# Altium schematic symbol library Semi-ATE.SchLib: 322 symbols (part 1 of 6)
Pins are listed as number, name and electrical type; pins without a type are passive.

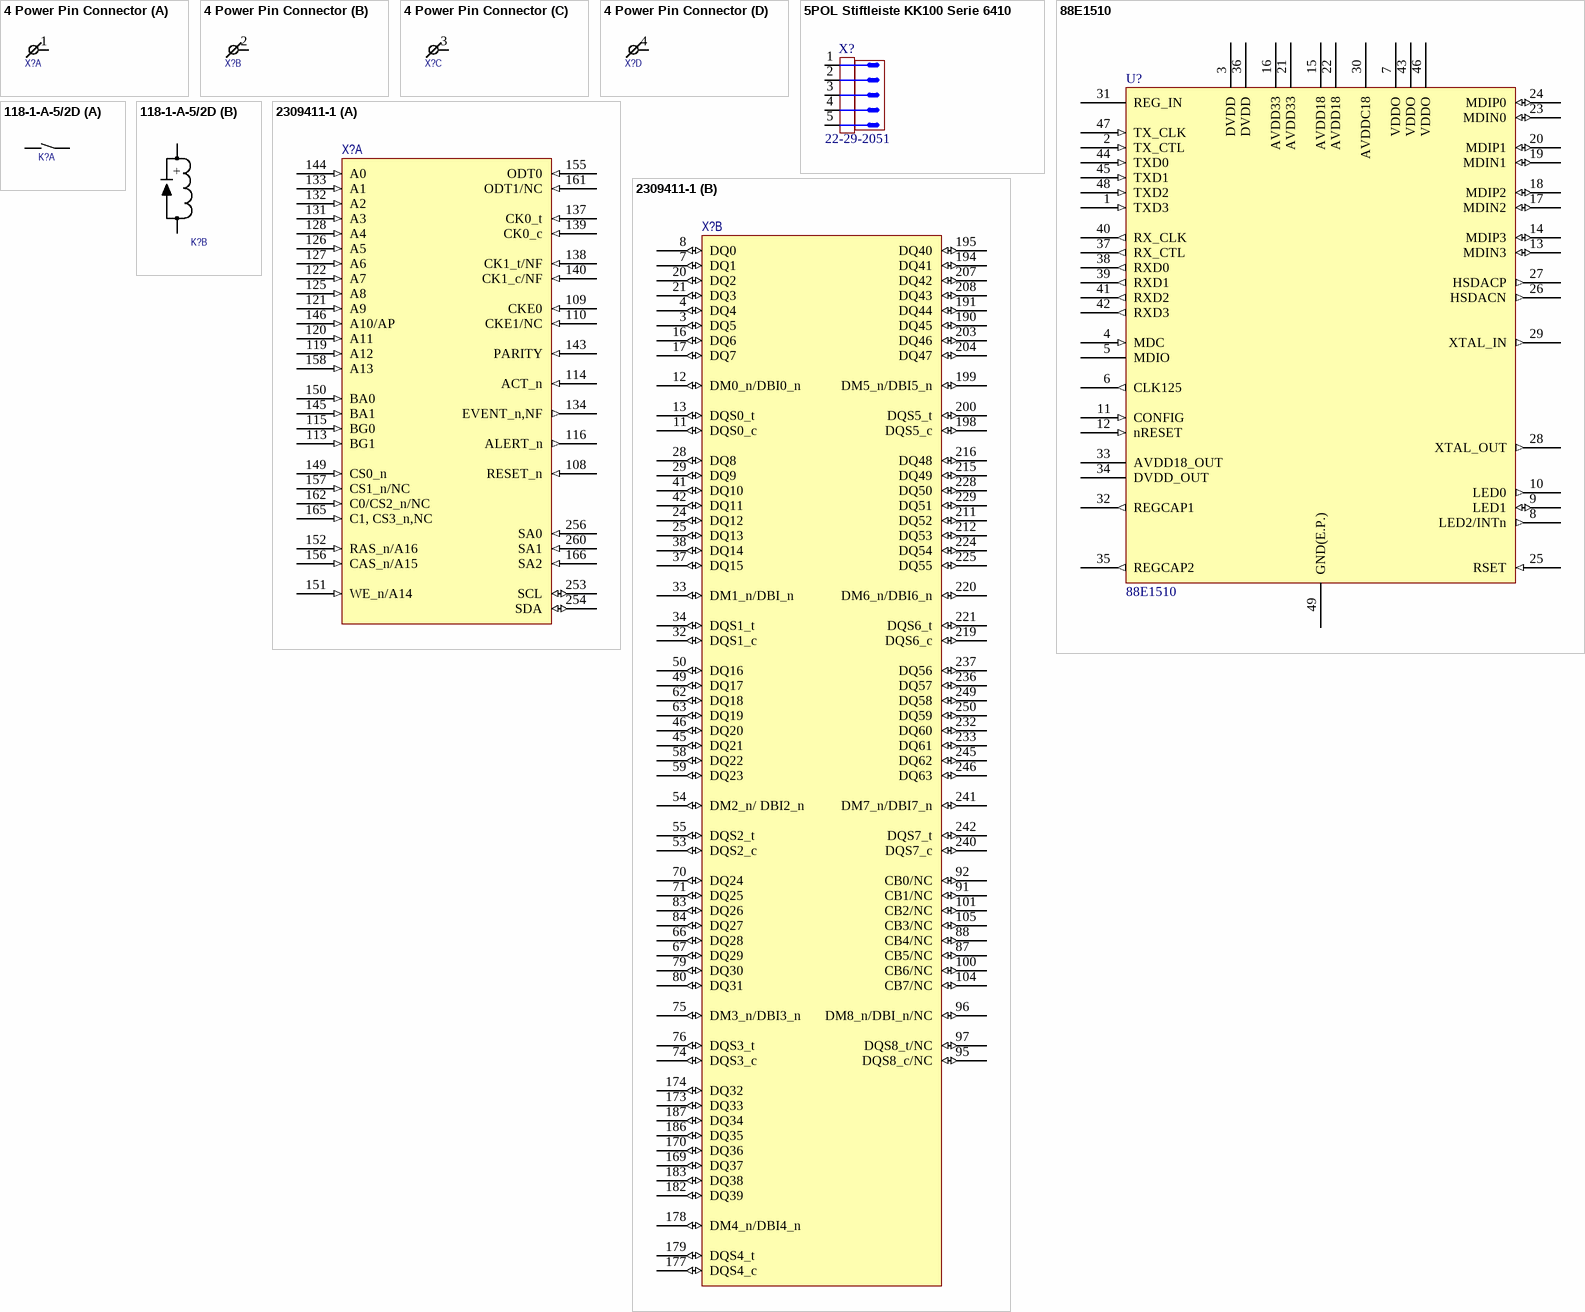
[diagram p0: symbols 4 Power Pin Connector to 2309411-1]

## 4 Power Pin Connector
designator X?, comment X  (value not drawn)
RA TERMINAL 4PM; 04. Manufacturer: Samtec Inc.; 07. Manufacturer  Part Number: EPTT-2-P-11.5-D-RA; 03. Unit Price: 5.0; 13. Created Date/Name: ??? / Hören; System: Connector; 3D-Export: Yes; 01. Distributor: Samtec Inc.; 02. Distributor Part Number: EPTT-2-P-11.5-D-RA; 11. RoHS: YES; ComponentLink1Description: Info; ComponentLink1URL: https://www.samtec.com/products/eptt-2-p-11.5-d-ra; ComponentLink2Description: DataSheet; ComponentLink2URL: http://suddendocs.samtec.com/catalog_english/eptt.pdf
footprint EPTS-2-P-D-VT-1 (Power MaxiSCT (Backplane Side))
footprint EPTT-2-P-11.5-D-RA (Power MaxiSCT (Card Side))
part A pins: 1
part B pins: 2
part C pins: 3
part D pins: 4

## 5POL Stiftleiste KK100 Serie 6410
designator X?, comment 07. Manufacturer  Part Number: 22-29-2051  (hidden comment: X)
CONN HEADER VERT 5POS 2.54MM; 04. Manufacturer: Molex; 03. Unit Price: 1.00; EN Voltage Proof: 2200kV; 3D-Export: No; 01. Distributor: Digi-Key; 02. Distributor Part Number: WM2747-ND; 11. RoHS: YES; ComponentLink1Description: Info; ComponentLink1URL: https://www.digikey.de/products/en?keywords=WM2747-ND; ComponentLink2Description: DataSheet; ComponentLink2URL: https://www.molex.com/pdm_docs/sd/022292051_sd.pdf
footprint MKS??????
footprint KK-6410-5 (Stiftleiste KK100 Serie 6410-5)
pins: 1, 2, 3, 4, 5

## 88E1510
designator U?, comment NicName: 88E1510  (hidden comment: U)
IC TXRX ETHERNET 10/100/1000 48QFN; MFR-PN: 88E1510-XX-NNB2I000; MFR: MARVEL; 04. Manufacturer: Marvell; 07. Manufacturer  Part Number: 88E1510-A0-NNB2C000; POPULATED: yes; 03. Unit Price: 11.26; 3D-Export: No; 01. Distributor: Mouser; 02. Distributor Part Number: 348-88E1510A0NNB2C00; 09. Operating Temperature: 0~70*C; 11. RoHS: YES; ComponentLink4Description: Info; ComponentLink4URL: https://www.mouser.de/ProductDetail/Marvell/88E1510-A0-NNB2C000?qs=%2Fha2pyFadujPvpXcm4trYvCwXzUYU8oAyO64EW4MIY0M8rmnB%2FMv6Nj0XhjAARXI; ComponentLink5Description: DataSheet; ComponentLink5URL: https://www.mouser.de/datasheet/2/912/arvell-phys-transceivers-alaska-88e151x-datasheet--1360912.pdf
footprint MARVEL-QFN48 (Footprint not found)
pins: 1 TXD3 (in), 2 TX_CTL (in), 3 DVDD (power), 4 MDC (in), 5 MDIO (hiz), 6 CLK125 (out), 7 VDDO (power), 8 LED2/INTn (out), 9 LED1 (io), 10 LED0 (out), 11 CONFIG (in), 12 nRESET (in), 13 MDIN3 (io), 14 MDIP3 (io), 15 AVDD18 (power), 16 AVDD33 (power), 17 MDIN2 (io), 18 MDIP2 (io), 19 MDIN1 (io), 20 MDIP1 (io), 21 AVDD33 (power), 22 AVDD18 (power), 23 MDIN0 (io), 24 MDIP0 (io), 25 RSET (in), 26 HSDACN (out), 27 HSDACP (out), 28 XTAL_OUT (out), 29 XTAL_IN (out), 30 AVDDC18 (power), 31 REG_IN (power), 32 REGCAP1 (out), 33 AVDD18_OUT (hiz), 34 DVDD_OUT (hiz), 35 REGCAP2 (out), 36 DVDD (power), 37 RX_CTL (out), 38 RXD0 (out), 39 RXD1 (out), 40 RX_CLK (out), 41 RXD2 (out), 42 RXD3 (out), 43 VDDO (power), 44 TXD0 (in), 45 TXD1 (in), 46 VDDO (power), 47 TX_CLK (in), 48 TXD2 (in), 49 GND(E.P.) (power)

## 118-1-A-5/2D
designator K?, comment K  (value not drawn)
5V Relais 1*Schließer 200V/500mA/1,2A Spule=2,2k ON=0,6ms/OFF=0,35ms Mech Life=10^9; 04. Manufacturer: Pickering; 07. Manufacturer  Part Number: 118-1-A-5/2D; 03. Unit Price: 2.60; 05. Quantity: 1000; 06. Data Sheet: Pickering_series_118.pdf; 13. Created Date/Name: 20.12.17 S. Kaiser; Coil Resistance: 1500 Ohm; Max Carry Current: 1.2 A; Max Switch Current: 1A; Max Switch Voltage: 200V; Power Rating: 15W; 3D-Export: Yes; 01. Distributor: Pickering; 02. Distributor Part Number: 118-1-A-5/2D; 09. Operating Temperature: -20°C ~ +85°C; 11. RoHS: 2011/65/EU; ComponentLink1Description: Info; ComponentLink1URL: http://www.pickeringrelay.com/; ComponentLink2Description: DataSheet; ComponentLink2URL: https://www.pickeringrelay.com/products/single-line-sil-series-111-119/single-line-sil-series-118/; Coil Voltage: 5V
footprint 118-1A (ATE Relay (NO))
part A pins: 3 CA, 4 CB
part B pins: 1 +, 2 -
1 alternate drawing of the same symbol

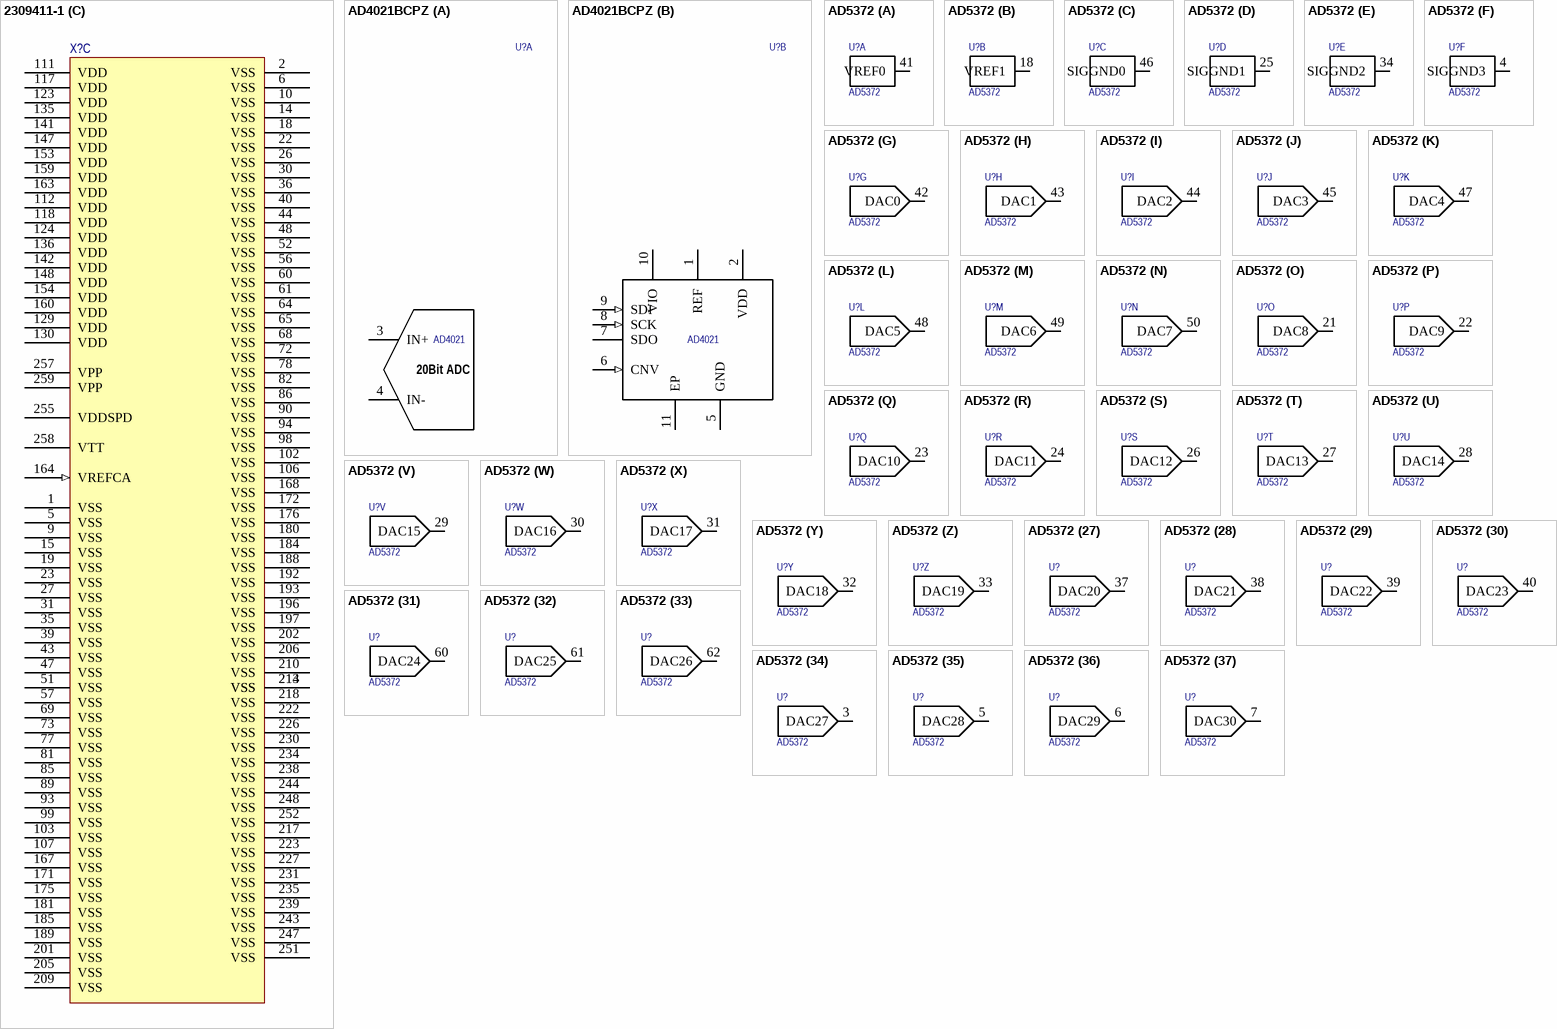
[diagram p1: symbols 2309411-1 to AD5372]

## 2309411-1
designator X?, comment X  (value not drawn)
DDR4 SODIMM 260P 8.0H STD; 04. Manufacturer: TE Connectivity AMP Connectors; 07. Manufacturer  Part Number: 2309411-1; 03. Unit Price: 1.7; 13. Created Date/Name: April 2019 / Hören; System: Connector; 3D-Export: Yes; 01. Distributor: DigiKey; 02. Distributor Part Number: A126762CT-ND; 11. RoHS: YES; ComponentLink1Description: Info; ComponentLink1URL: https://www.digikey.de/product-detail/en/te-connectivity-amp-connectors/2309411-1/A126762CT-ND/7793546; ComponentLink2Description: DataSheet; ComponentLink2URL: https://www.te.com/commerce/DocumentDelivery/DDEController?Action=srchrtrv&DocNm=2309411&DocType=Customer+Drawing&DocLang=English
footprint 2309411-1 (DDR4 SODIMM 260P 8.0H STD)
part A pins: 108 RESET_n (in), 109 CKE0 (in), 110 CKE1/NC (in), 113 BG1 (in), 114 ACT_n (in), 115 BG0 (in), 116 ALERT_n (out), 119 A12 (in), 120 A11 (in), 121 A9 (in), 122 A7 (in), 125 A8 (in), 126 A5 (in), 127 A6 (in), 128 A4 (in), 131 A3 (in), 132 A2 (in), 133 A1 (in), 134 EVENT_n,NF (out), 137 CK0_t (in), 138 CK1_t/NF (in), 139 CK0_c (in), 140 CK1_c/NF (in), 143 PARITY (in), 144 A0 (in), 145 BA1 (in), 146 A10/AP (in), 149 CS0_n (in), 150 BA0 (in), 151 WE_n/A14 (in), 152 RAS_n/A16 (in), 155 ODT0 (in), 156 CAS_n/A15 (in), 157 CS1_n/NC (in), 158 A13 (in), 161 ODT1/NC (in), 162 C0/CS2_n/NC (in), 165 C1, CS3_n,NC (in), 166 SA2 (in), 253 SCL (io), 254 SDA (io), 256 SA0 (in), 260 SA1 (in)
part B pins: 3 DQ5 (io), 4 DQ4 (io), 7 DQ1 (io), 8 DQ0 (io), 11 DQS0_c (io), 12 DM0_n/DBI0_n (io), 13 DQS0_t (io), 16 DQ6 (io), 17 DQ7 (io), 20 DQ2 (io), 21 DQ3 (io), 24 DQ12 (io), 25 DQ13 (io), 28 DQ8 (io), 29 DQ9 (io), 32 DQS1_c (io), 33 DM1_n/DBI_n (io), 34 DQS1_t (io), 37 DQ15 (io), 38 DQ14 (io), 41 DQ10 (io), 42 DQ11 (io), 45 DQ21 (io), 46 DQ20 (io), 49 DQ17 (io), 50 DQ16 (io), 53 DQS2_c (io), 54 DM2_n/ DBI2_n (io), 55 DQS2_t (io), 58 DQ22 (io), 59 DQ23 (io), 62 DQ18 (io), 63 DQ19 (io), 66 DQ28 (io), 67 DQ29 (io), 70 DQ24 (io), 71 DQ25 (io), 74 DQS3_c (io), 75 DM3_n/DBI3_n (io), 76 DQS3_t (io), 79 DQ30 (io), 80 DQ31 (io), 83 DQ26 (io), 84 DQ27 (io), 87 CB5/NC (io), 88 CB4/NC (io), 91 CB1/NC (io), 92 CB0/NC (io), 95 DQS8_c/NC (io), 96 DM8_n/DBI_n/NC (io), 97 DQS8_t/NC (io), 100 CB6/NC (io), 101 CB2/NC (io), 104 CB7/NC (io), 105 CB3/NC (io), 169 DQ37 (io), 170 DQ36 (io), 173 DQ33 (io), 174 DQ32 (io), 177 DQS4_c (io), 178 DM4_n/DBI4_n (io), 179 DQS4_t (io), 182 DQ39 (io), 183 DQ38 (io), 186 DQ35 (io), 187 DQ34 (io), 190 DQ45 (io), 191 DQ44 (io), 194 DQ41 (io), 195 DQ40 (io), 198 DQS5_c (io), 199 DM5_n/DBI5_n (io), 200 DQS5_t (io), 203 DQ46 (io), 204 DQ47 (io), 207 DQ42 (io), 208 DQ43 (io), 211 DQ52 (io), 212 DQ53 (io), 215 DQ49 (io), 216 DQ48 (io), 219 DQS6_c (io), 220 DM6_n/DBI6_n (io), 221 DQS6_t (io), 224 DQ54 (io), 225 DQ55 (io), 228 DQ50 (io), 229 DQ51 (io), 232 DQ60 (io), 233 DQ61 (io), 236 DQ57 (io), 237 DQ56 (io), 240 DQS7_c (io), 241 DM7_n/DBI7_n (io), 242 DQS7_t (io), 245 DQ62 (io), 246 DQ63 (io), 249 DQ58 (io), 250 DQ59 (io)
part C pins: 1 VSS (power), 2 VSS (power), 5 VSS (power), 6 VSS (power), 9 VSS (power), 10 VSS (power), 14 VSS (power), 15 VSS (power), 18 VSS (power), 19 VSS (power), 22 VSS (power), 23 VSS (power), 26 VSS (power), 27 VSS (power), 30 VSS (power), 31 VSS (power), 35 VSS (power), 36 VSS (power), 39 VSS (power), 40 VSS (power), 43 VSS (power), 44 VSS (power), 47 VSS (power), 48 VSS (power), 51 VSS (power), 52 VSS (power), 56 VSS (power), 57 VSS (power), 60 VSS (power), 61 VSS (power), 64 VSS (power), 65 VSS (power), 68 VSS (power), 69 VSS (power), 72 VSS (power), 73 VSS (power), 77 VSS (power), 78 VSS (power), 81 VSS (power), 82 VSS (power), 85 VSS (power), 86 VSS (power), 89 VSS (power), 90 VSS (power), 93 VSS (power), 94 VSS (power), 98 VSS (power), 99 VSS (power), 102 VSS (power), 103 VSS (power), 106 VSS (power), 107 VSS (power), 111 VDD (power), 112 VDD (power), 117 VDD (power), 118 VDD (power), 123 VDD (power), 124 VDD (power), 129 VDD (power), 130 VDD (power), 135 VDD (power), 136 VDD (power), 141 VDD (power), 142 VDD (power), 147 VDD (power), 148 VDD (power), 153 VDD (power), 154 VDD (power), 159 VDD (power), 160 VDD (power), 163 VDD (power), 164 VREFCA (in), 167 VSS (power), 168 VSS (power), 171 VSS (power), 172 VSS (power), 175 VSS (power), 176 VSS (power), 180 VSS (power), 181 VSS (power), 184 VSS (power), 185 VSS (power), 188 VSS (power), 189 VSS (power), 192 VSS (power), 193 VSS (power), 196 VSS (power), 197 VSS (power), 201 VSS (power), 202 VSS (power), 205 VSS (power), 206 VSS (power), 209 VSS (power), 210 VSS (power), 213 VSS (power), 214 VSS (power), 217 VSS (power), 218 VSS (power), 222 VSS (power), 223 VSS (power), 226 VSS (power), 227 VSS (power), 230 VSS (power), 231 VSS (power), 234 VSS (power), 235 VSS (power), 238 VSS (power), 239 VSS (power), 243 VSS (power), 244 VSS (power), 247 VSS (power), 248 VSS (power), 251 VSS (power), 252 VSS (power), 255 VDDSPD (power), 257 VPP (power), 258 VTT (power), 259 VPP (power)

## AD4021BCPZ
designator U?, comment NicName: AD4021  (hidden comment: U)
IC ADC 20BIT SAR 10LFCSP 1 MSPS; 04. Manufacturer: Analog Devices Inc.; 07. Manufacturer  Part Number: AD4021BCPZ-R2; 03. Unit Price: 31.81; 13. Created Date/Name: AUG 2018 / Hören; ComponentLink1Description: Info; ComponentLink1URL: https://www.digikey.de/products/en/integrated-circuits-ics/data-acquisition-analog-to-digital-converters-adc/700?k=AD4020BCPZ&k=&pkeyword=AD4020BCPZ&sv=0&pv7=243&sf=0&quantity=&ColumnSort=0&page=1&pageSize=25; ComponentLink2Description: DataSheet; ComponentLink2URL: https://www.analog.com/media/en/technical-documentation/data-sheets/AD4020-4021-4022.pdf; 01. Distributor: Digi-Key; 02. Distributor Part Number: https://www.digikey.de/products/en?keywords=505-AD4021BCPZ-R2DKR-ND; 09. Operating Temperature: -40°C ~ 125°C
footprint CP-10-9 (10-LFCSP (3x3))
part A pins: 3 IN+, 4 IN-
part B pins: 1 REF, 2 VDD, 5 GND, 6 CNV (in), 7 SDO, 8 SCK (in), 9 SDI (in), 10 VIO, 11 EP
part A text: 20Bit ADC

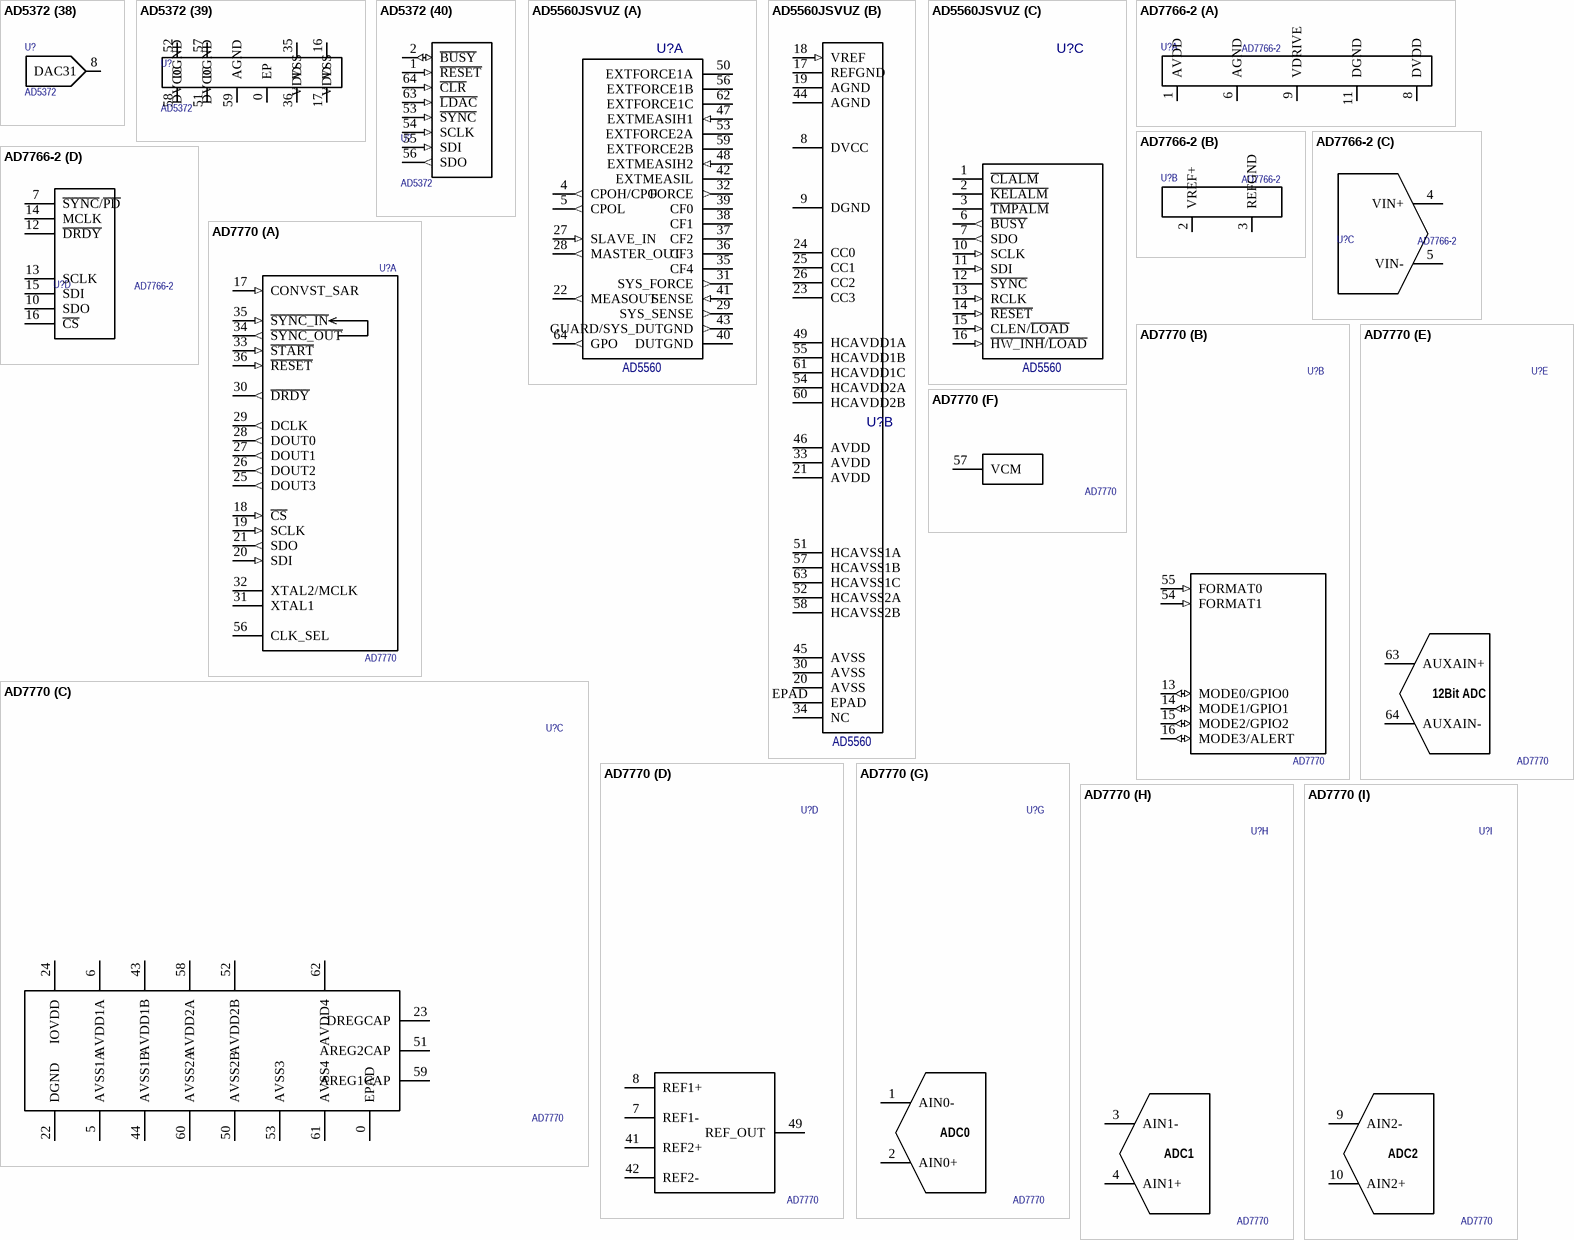
[diagram p2: symbols AD5372 to AD7770]

## AD5372
designator U?, comment NicName: AD5372  (hidden comment: U)
IC DAC 16BIT 32CH SER 56-LFCSP; 04. Manufacturer: Analog Devices Inc.; 07. Manufacturer  Part Number: AD5372BCPZ; 03. Unit Price: 76.51; 13. Created Date/Name: AUG 2018 / Hören; Design: AWGDIG; 3D-Export: No; ComponentLink1Description: Info; ComponentLink1URL: http://be.farnell.com/analog-devices/ad5373bcpz/dac-32-ch-14bit-540ksps-lfcsp/dp/2461392?ost=AD5373BCPZ&selectedCategoryId=&categoryNameResp=Alles&searchView=table&iscrfnonsku=false; ComponentLink2Description: DataSheet; ComponentLink2URL: http://www.analog.com/media/en/technical-documentation/data-sheets/AD5372_5373.pdf; 01. Distributor: DigiKey; 02. Distributor Part Number: AD5372BCPZ-ND; 09. Operating Temperature: -40°C ~ 85°C; 11. RoHS: YES; Package: 56-LFCSP-VQ
footprint CP-64-3 (64-Lead Lead Frame Chip Scale Package [LFCSP_VQ])
part A pins: 41 VREF0
part B pins: 18 VREF1
part C pins: 46 SIGGND0
part D pins: 25 SIGGND1
part E pins: 34 SIGGND2
part F pins: 4 SIGGND3
part G pins: 42 DAC0
part H pins: 43 DAC1
part I pins: 44 DAC2
part J pins: 45 DAC3
part K pins: 47 DAC4
part L pins: 48 DAC5
part M pins: 49 DAC6
part N pins: 50 DAC7
part O pins: 21 DAC8
part P pins: 22 DAC9
part Q pins: 23 DAC10
part R pins: 24 DAC11
part S pins: 26 DAC12
part T pins: 27 DAC13
part U pins: 28 DAC14
part V pins: 29 DAC15
part W pins: 30 DAC16
part X pins: 31 DAC17
part Y pins: 32 DAC18
part Z pins: 33 DAC19
part 27 pins: 37 DAC20
part 28 pins: 38 DAC21
part 29 pins: 39 DAC22
part 30 pins: 40 DAC23
part 31 pins: 60 DAC24
part 32 pins: 61 DAC25
part 33 pins: 62 DAC26
part 34 pins: 3 DAC27
part 35 pins: 5 DAC28
part 36 pins: 6 DAC29
part 37 pins: 7 DAC30
part 38 pins: 8 DAC31
part 39 pins: 0 EP, 16 VDD, 17 VSS, 35 VDD, 36 VSS, 51 DGND, 52 DVCC, 57 DVCC, 58 DGND, 59 AGND
part 40 pins: 1 ~{RESET} (in), 2 ~{BUSY} (io), 53 ~{SYNC} (in), 54 SCLK (in), 55 SDI (in), 56 SDO (out), 63 ~{LDAC} (in), 64 ~{CLR} (in)
part 41 pins: 9 NC, 10 NC, 11 NC, 12 NC, 13 NC, 14 NC, 15 NC, 19 NC, 20 NC

## AD5560JSVUZ
designator U?, comment Nickname: AD5560  (hidden comment: U)
IC POWER SUPPLY 64TQFP; 04. Manufacturer: Analog Devices Inc.; 07. Manufacturer  Part Number: AD5560JSVUZ-REEL; 03. Unit Price: 32.56; 13. Created Date/Name: AUG 2018 / Hören; ComponentLink1Description: Info; ComponentLink1URL: https://www.digikey.de/products/en?keywords=%20%09AD5560JSVUZ-REELDKR-ND; 01. Distributor: DigiKey; 02. Distributor Part Number: AD5560JSVUZ-REELDKR-ND; 09. Operating Temperature: -25°C ~ 150°C; ComponentLink2Description: DataSheet; ComponentLink2URL: https://www.analog.com/media/en/technical-documentation/data-sheets/AD5560.pdf
footprint Q64.10x10E
part A pins: 4 CPOH/CPO (out), 5 CPOL (out), 22 MEASOUT (out), 27 SLAVE_IN (in), 28 MASTER_OUT (out), 29 SYS_SENSE (out), 31 SYS_FORCE (out), 32 FORCE (out), 35 CF4, 36 CF3, 37 CF2, 38 CF1, 39 CF0, 40 DUTGND (power), 41 SENSE (in), 42 EXTMEASIL, 43 GUARD/SYS_DUTGND (out), 47 EXTMEASIH1 (in), 48 EXTMEASIH2 (in), 50 EXTFORCE1A, 53 EXTFORCE2A, 56 EXTFORCE1B, 59 EXTFORCE2B, 62 EXTFORCE1C, 64 GPO (out)
part B pins: 8 DVCC (power), 9 DGND (power), 17 REFGND (power), 18 VREF (in), 19 AGND (power), 20 AVSS (power), 21 AVDD (power), 23 CC3, 24 CC0, 25 CC1, 26 CC2, 30 AVSS (power), 33 AVDD (power), 34 NC, 44 AGND (power), 45 AVSS (power), 46 AVDD (power), 49 HCAVDD1A (power), 51 HCAVSS1A (power), 52 HCAVSS2A (power), 54 HCAVDD2A (power), 55 HCAVDD1B (power), 57 HCAVSS1B (power), 58 HCAVSS2B (power), 60 HCAVDD2B (power), 61 HCAVDD1C (power), 63 HCAVSS1C (power), EPAD
part C pins: 1 ~{CLALM}, 2 ~{KELALM}, 3 ~{TMPALM}, 6 ~{BUSY} (out), 7 SDO (out), 10 SCLK (in), 11 SDI (in), 12 ~{SYNC}, 13 RCLK (in), 14 ~{RESET} (in), 15 CLEN/~{LOAD} (in), 16 ~{HW_INH}/~{LOAD} (in)

## AD7766-2
designator U?, comment NicName: AD7766-2  (hidden comment: U)
IC ADC 24BIT 32KSPS SAR 16TSSOP; 04. Manufacturer: Analog Devices; 07. Manufacturer  Part Number: AD7766BRUZ-2; 03. Unit Price: 11.07; 05. Quantity: 1; 13. Created Date/Name: AUG 2018 / Hören; 3D-Export: No; 01. Distributor: DigiKey; 02. Distributor Part Number: AD7766BRUZ-2-ND; 09. Operating Temperature: -40°C ~ 105°C; 11. RoHS: YES; ComponentLink1Description: Info; ComponentLink1URL: https://www.digikey.de/product-detail/en/analog-devices-inc/AD7766BRUZ-2/AD7766BRUZ-2-ND/1680410; ComponentLink2Description: DataSheet; ComponentLink2URL: http://www.analog.com/media/en/technical-documentation/data-sheets/AD7766.pdf; Package: TSSOP16
footprint TSSOP16(RU-16) (16-Lead Thin Shrink Small Outline Package)
part A pins: 1 AVDD, 6 AGND, 8 DVDD, 9 VDRIVE, 11 DGND
part B pins: 2 VREF+, 3 REFGND
part C pins: 4 VIN+, 5 VIN-
part D pins: 7 ~{SYNC}/~{PD}, 10 SDO, 12 ~{DRDY}, 13 SCLK, 14 MCLK, 15 SDI, 16 ~{CS}

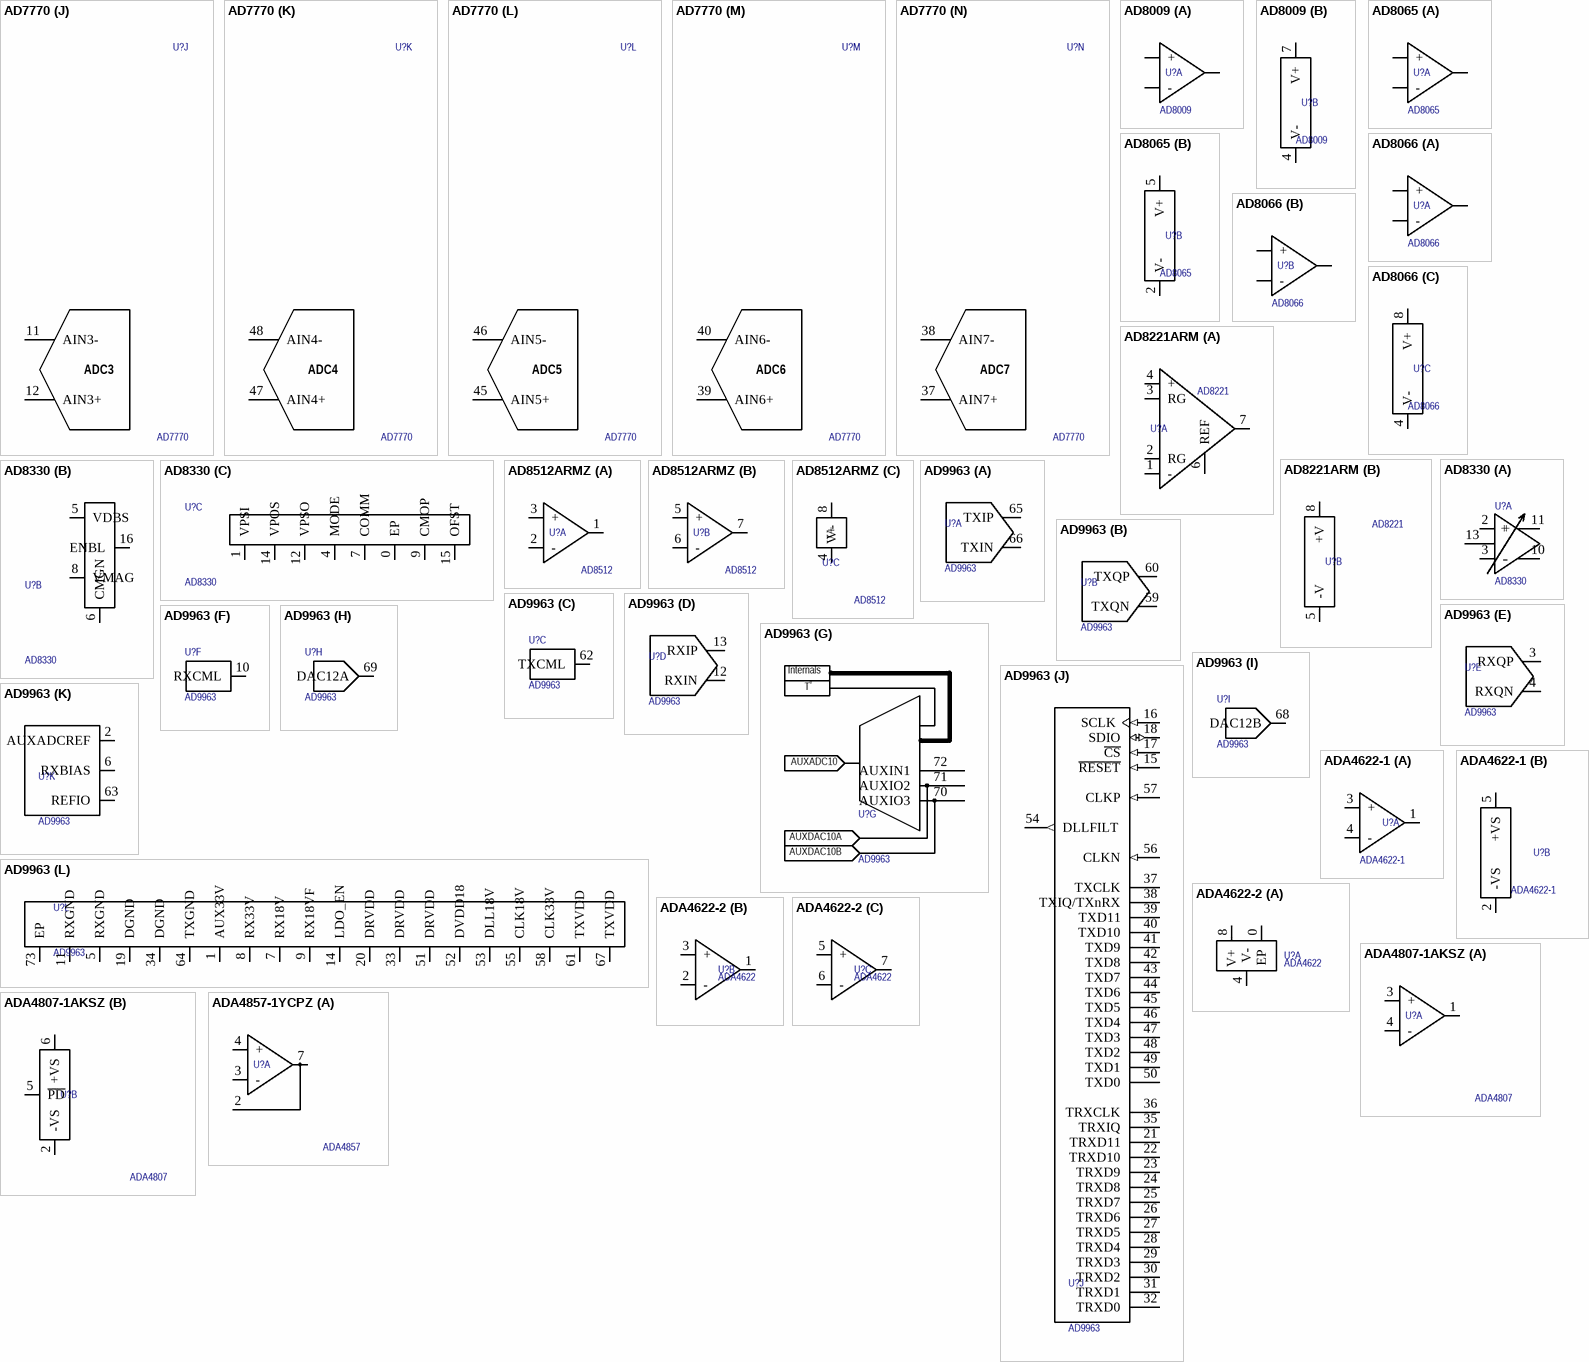
[diagram p3: symbols AD7770 to ADA4857-1YCPZ]

## AD7770
designator U?, comment NicName: AD7770  (hidden comment: U)
ADC 24BIT 32KSPS 64LFCSP; 04. Manufacturer: Analog Devices Inc.; 07. Manufacturer  Part Number: AD7770ACPZ; 03. Unit Price: 13.99; 13. Created Date/Name: AUG 2018 / Hören; 3D-Export: No; ComponentLink1Description: Info; ComponentLink1URL: https://www.digikey.de/products/en?keywords=2576407; ComponentLink2Description: DataSheet; ComponentLink2URL: https://www.analog.com/media/en/technical-documentation/data-sheets/AD7770.pdf; 01. Distributor: Digi-Key; 02. Distributor Part Number: AD7770ACPZ-ND; 09. Operating Temperature: -40°C ~ 125°C
ibis ad7770 (Model Description)
footprint cp-64-15 (64 Lead LFCSP)
part A pins: 17 CONVST_SAR (in), 18 ~{CS} (in), 19 SCLK (in), 20 SDI (in), 21 SDO (out), 25 DOUT3 (out), 26 DOUT2 (out), 27 DOUT1 (out), 28 DOUT0 (out), 29 DCLK (out), 30 ~{DRDY} (out), 31 XTAL1, 32 XTAL2/MCLK, 33 ~{START} (in), 34 ~{SYNC_OUT} (out), 35 ~{SYNC_IN} (in), 36 ~{RESET} (in), 56 CLK_SEL
part B pins: 13 MODE0/GPIO0 (io), 14 MODE1/GPIO1 (io), 15 MODE2/GPIO2 (io), 16 MODE3/ALERT (io), 54 FORMAT1 (in), 55 FORMAT0 (in)
part C pins: 0 EPAD (power), 5 AVSS1A (power), 6 AVDD1A (power), 22 DGND (power), 23 DREGCAP, 24 IOVDD (power), 43 AVDD1B (power), 44 AVSS1B (power), 50 AVSS2B (power), 51 AREG2CAP, 52 AVDD2B (power), 53 AVSS3 (power), 58 AVDD2A (power), 59 AREG1CAP, 60 AVSS2A (power), 61 AVSS4 (power), 62 AVDD4 (power)
part D pins: 7 REF1-, 8 REF1+, 41 REF2+, 42 REF2-, 49 REF_OUT
part E pins: 63 AUXAIN+, 64 AUXAIN-
part F pins: 57 VCM
part G pins: 1 AIN0-, 2 AIN0+
part H pins: 3 AIN1-, 4 AIN1+
part I pins: 9 AIN2-, 10 AIN2+
part J pins: 11 AIN3-, 12 AIN3+
part K pins: 47 AIN4+, 48 AIN4-
part L pins: 45 AIN5+, 46 AIN5-
part M pins: 39 AIN6+, 40 AIN6-
part N pins: 37 AIN7+, 38 AIN7-
part E text: 12Bit ADC
part G text: ADC0
part H text: ADC1
part I text: ADC2
part J text: ADC3
part K text: ADC4
part L text: ADC5
part M text: ADC6
part N text: ADC7

## AD8009
designator U?, comment NicName: AD8009  (hidden comment: U)
IC OPAMP CFA 845MHZ SOT23-5; 04. Manufacturer: Analog Devices Inc.; 07. Manufacturer  Part Number: AD8009JRTZ-REEL7; 03. Unit Price: 3.67; 13. Created Date/Name: AUG 2018 / Hören; Design: AWGDIG; 3D-Export: No; ComponentLink1URL: https://www.digikey.de/products/en/integrated-circuits-ics/linear-amplifiers-instrumentation-op-amps-buffer-amps/687?k=AD8009&k=&pkeyword=AD8009&pv7=243&sf=0&FV=142c000b%2Cffe002af%2C1f140000&quantity=&ColumnSort=0&page=1&pageSize=25; ComponentLink1Description: Info; ComponentLink2Description: DataSheet; ComponentLink2URL: https://www.analog.com/media/en/technical-documentation/data-sheets/AD8009.pdf; 01. Distributor: DigiKey; 02. Distributor Part Number: AD8009JRTZ-REEL7DKR-ND; 09. Operating Temperature: 0°C ~ 70°C; 11. RoHS: YES; Package: SOT23-5
simulation model AD8009AN (Model Description)
footprint SOIC8 (R-8) (Generic 8 lead SOIC Narrow Body)
footprint SOT23-5 (SOT 23 5 lead); pin to pad 2>4 4>2 6>1 7>5
part A pins: 2 -, 3 +, 6 Out
part B pins: 4 V-, 7 V+

## AD8065
designator U?, comment NicName: AD8065  (hidden comment: U)
IC OPAMP VFB 145MHZ RRO SOT23-5; 04. Manufacturer: Analog Devices Inc.; 07. Manufacturer  Part Number: AD8065ARTZ-REEL7; 03. Unit Price: 3.34; 13. Created Date/Name: AUG 2018 / Hören; 3D-Export: No; ComponentLink1Description: Info; ComponentLink1URL: https://www.digikey.de/product-detail/en/analog-devices-inc/AD8065ARTZ-REEL7/AD8065ARTZ-REEL7DKR-ND/1765607; ComponentLink2Description: DataSheet; ComponentLink2URL: http://www.analog.com/media/en/technical-documentation/data-sheets/AD8065_8066.pdf; 01. Distributor: DigiKey; 02. Distributor Part Number: AD8065ARTZ-REEL7DKR-ND; Package: SOT23-5
simulation model AD8065 (Model Description)
footprint SOT23-5 (SOT 23 5 lead)
part A pins: 1 Out, 3 +, 4 -
part B pins: 2 V-, 5 V+

## AD8066
designator U?, comment NicName: AD8066  (hidden comment: U)
IC OPAMP VFB 145MHZ RRO 8MSOP; 04. Manufacturer: Analog Devices Inc.; 07. Manufacturer  Part Number: AD8066ARMZ-REEL7; 03. Unit Price: 5.66; 13. Created Date/Name: AUG 2018 / Hören; Design: AWGDIG; 3D-Export: No; 01. Distributor: DigiKey; 02. Distributor Part Number: AD8066ARMZ-REEL7DKR-ND; 11. RoHS: YES; ComponentLink1Description: Info; ComponentLink1URL: https://www.digikey.de/products/en/integrated-circuits-ics/linear-amplifiers-instrumentation-op-amps-buffer-amps/687?k=AD8066&k=&pkeyword=AD8066&pv16=12682&sf=0&FV=1f140000%2Cffe002af%2C1c00f3&quantity=&ColumnSort=0&page=1&pageSize=25; ComponentLink2Description: DataSheet; ComponentLink2URL: https://www.analog.com/media/en/technical-documentation/data-sheets/AD8065_8066.pdf; Package: MSOP8 (RM8)
footprint MSOP8(RM-8) (8-Lead MSOP)
part A pins: 1 Out, 2 -, 3 +
part B pins: 5 +, 6 -, 7 Out
part C pins: 4 V-, 8 V+

## AD8221ARM
designator U?, comment NicName: AD8221  (hidden comment: U)
IC INST AMP 1 CIRCUIT 8MSOP; 04. Manufacturer: Analog Devices Inc.; 07. Manufacturer  Part Number: AD8221ARMZ-R7; 03. Unit Price: 5.10; 13. Created Date/Name: AUG 2018 / Hören; Design: AWGDIG; 3D-Export: No; ComponentLink1URL: https://www.digikey.de/products/en?keywords=AD8221ARMZ-R7DKR-ND; ComponentLink1Description: Info; ComponentLink2Description: DataSheet; ComponentLink2URL: https://www.analog.com/media/en/technical-documentation/data-sheets/AD8221.pdf; 01. Distributor: DigiKey; 02. Distributor Part Number: AD8221ARMZ-R7DKR-ND; 09. Operating Temperature: 0°C ~ 85°C; 11. RoHS: YES; Package: MSOP8
footprint MSOP8(RM-8) (8-Lead MSOP)
part A pins: 1 -, 2 RG, 3 RG, 4 +, 6 REF, 7 VOUT
part B pins: 5 -V (power), 8 +V (power)

## AD8330
designator U?, comment NicName: AD8330  (hidden comment: U)
IC OPAMP VGA 150MHZ RRO 16LFCSP; 04. Manufacturer: Analog Devices Inc.; 07. Manufacturer  Part Number: AD8330ACPZ-R7; 03. Unit Price: 9.88; 13. Created Date/Name: AUG 2018 / Hören; Design: AWGDIG; 3D-Export: No; 01. Distributor: DigiKey; 02. Distributor Part Number: AD8330ACPZ-R7DKR-ND; 09. Operating Temperature: -40°C ~ 85°C; 11. RoHS: YES; ComponentLink1Description: Info; ComponentLink1URL: https://www.digikey.de/products/en/integrated-circuits-ics/linear-amplifiers-instrumentation-op-amps-buffer-amps/687?k=AD8330ACPZ&k=&pkeyword=AD8330ACPZ&pv7=243&sf=0&FV=ffe002af%2C1f140000&quantity=&ColumnSort=0&page=1&pageSize=25; ComponentLink2Description: DataSheet; ComponentLink2URL: https://www.analog.com/media/en/technical-documentation/data-sheets/AD8330.pdf; Package: 16LFCSP (CP-16-27)
footprint CP-16-27 (16 lead LFCSP)
part A pins: 2 + "INHI", 3 - "INLO", 10 - "OPLO", 11 + "OPHI", 13 CNTR
part B pins: 5 VDBS, 6 CMGN "VDBS", 8 VMAG, 16 ENBL
part C pins: 0 EP, 1 VPSI, 4 MODE, 7 COMM, 9 CMOP, 12 VPSO, 14 VPOS, 15 OFST
1 alternate drawing of the same symbol

## AD8512ARMZ
designator U?, comment NicName: AD8512  (hidden comment: U)
IC OPAMP JFET 2 CIRCUIT 8MSOP; 04. Manufacturer: Analog Devices Inc.; 07. Manufacturer  Part Number: AD8066ARMZ-REEL7; 03. Unit Price: 3.58; 13. Created Date/Name: AUG 2018 / Hören; Design: AWGDIG; 3D-Export: No; 01. Distributor: DigiKey; 02. Distributor Part Number: AD8512ARMZ-REELDKR-ND; 11. RoHS: YES; ComponentLink1Description: Info; ComponentLink1URL: https://www.digikey.de/products/de/integrated-circuits-ics/linear-amplifiers-instrumentation-op-amps-buffer-amps/687?k=AD8512&k=&pkeyword=AD8512&sv=0&pv1291=294620&sf=0&FV=1989%7C0%2C-8%7C687%2C7%7C243&quantity=&ColumnSort=0&page=1&pageSize=25; ComponentLink2Description: DataSheet; ComponentLink2URL: https://www.analog.com/media/en/technical-documentation/data-sheets/AD8510_8512_8513.pdf; Package: MSOP8 (RM8)
footprint MSOP8(RM-8) (8-Lead MSOP)
part A pins: 1 OUTA, 2 -, 3 +
part B pins: 5 +, 6 -, 7 OUTB
part C pins: 4 V- (power), 8 V+ (power)

## AD9963
designator U?, comment NicName: AD9963  (hidden comment: U)
IC BROADBAND FRONT-END 72LFCSP; 04. Manufacturer: Analog Devices Inc.; 07. Manufacturer  Part Number: AD9963BCPZ; 03. Unit Price: 43.55; 13. Created Date/Name: AUG 2018 / Hören; 3D-Export: No; ComponentLink1Description: Info; ComponentLink1URL: https://www.digikey.de/product-detail/en/analog-devices-inc/AD9963BCPZ/AD9963BCPZ-ND/2606835; ComponentLink2Description: DataSheet; ComponentLink2URL: https://www.analog.com/media/en/technical-documentation/data-sheets/AD9961_9963.pdf; 01. Distributor: DigiKey; 02. Distributor Part Number: AD9963BCPZ-ND; 11. RoHS: YES
ibis AD9963 (Model Description)
footprint CP-72-4 (72 Lead LFCSP_VQ (10x10mm))
part A pins: 65 TXIP, 66 TXIN
part B pins: 59 TXQN, 60 TXQP
part C pins: 62 TXCML
part D pins: 12 RXIN, 13 RXIP
part E pins: 3 RXQP, 4 RXQN
part F pins: 10 RXCML
part G pins: 70 AUXIO3, 71 AUXIO2, 72 AUXIN1
part H pins: 69 DAC12A
part I pins: 68 DAC12B
part J pins: 15 ~{RESET} (in) "RESET", 16 SCLK (in) "CK", 17 ~{CS} (in) "STB", 18 SDIO (io), 21 TRXD11, 22 TRXD10, 23 TRXD9, 24 TRXD8, 25 TRXD7, 26 TRXD6, 27 TRXD5, 28 TRXD4, 29 TRXD3, 30 TRXD2, 31 TRXD1, 32 TRXD0, 35 TRXIQ, 36 TRXCLK, 37 TXCLK, 38 TXIQ/TXnRX, 39 TXD11, 40 TXD10, 41 TXD9, 42 TXD8, 43 TXD7, 44 TXD6, 45 TXD5, 46 TXD4, 47 TXD3, 48 TXD2, 49 TXD1, 50 TXD0, 54 DLLFILT (out), 56 CLKN (in), 57 CLKP (in)
part K pins: 2 AUXADCREF, 6 RXBIAS, 63 REFIO
part L pins: 1 AUX33V, 5 RXGND, 7 RX18V, 8 RX33V, 9 RX18VF, 11 RXGND, 14 LDO_EN, 19 DGND, 20 DRVDD, 33 DRVDD, 34 DGND, 51 DRVDD, 52 DVDD18, 53 DLL18V, 55 CLK18V, 58 CLK33V, 61 TXVDD, 64 TXGND, 67 TXVDD, 73 EP
part G text: Internals; T˚; AUXADC10; AUXDAC10A; AUXDAC10B

## ADA4622-1
designator U?, comment NicName: ADA4622-1  (hidden comment: U)
IC OPAMP JFET 1 CIRCUIT SOT23-5; 04. Manufacturer: Analog Devices Inc.; 07. Manufacturer  Part Number: ADA4622-1ARJZ-R2; 03. Unit Price: 3.77; 13. Created Date/Name: AUG 2018 / Hören; 3D-Export: No; ComponentLink1Description: Info; ComponentLink2Description: DataSheet; ComponentLink1URL: https://www.digikey.de/product-detail/en/analog-devices-inc/ADA4622-1ARJZ-R7/ADA4622-1ARJZ-R7DKR-ND/8753324; ComponentLink2URL: https://www.analog.com/media/en/technical-documentation/data-sheets/ADA4622-1-4622-2-4622-4.pdf; 01. Distributor: DigiKey; 02. Distributor Part Number: ADA4622-1ARJZ-R2DKR-ND; 09. Operating Temperature: -40°C ~ 125°C; 11. RoHS: YES; Package: SOT23-5
footprint SOT23-5 (SOT 23 5 lead)
part A pins: 1 Out, 3 +, 4 -
part B pins: 2 -VS, 5 +VS

## ADA4622-2
designator U?, comment NicName: ADA4622  (hidden comment: U)
IC OPAMP GP 8MHZ RRO SOT23-5; 04. Manufacturer: Analog Devices Inc.; 07. Manufacturer  Part Number: ADA4622-2ARMZ-R7; 03. Unit Price: 5.53; 13. Created Date/Name: AUG 2018 / Hören; 3D-Export: No; ComponentLink1Description: Info; ComponentLink2Description: DataSheet; ComponentLink1URL: https://www.digikey.de/product-detail/en/analog-devices-inc/ADA4622-1ARJZ-R7/ADA4622-1ARJZ-R7DKR-ND/8753324; ComponentLink2URL: https://www.analog.com/media/en/technical-documentation/data-sheets/ADA4622-1-4622-2-4622-4.pdf; 01. Distributor: DigiKey; 02. Distributor Part Number: ADA4622-2ARMZ-R7DKR-ND; 09. Operating Temperature: -40°C ~ 125°C; 11. RoHS: YES; Package: MSOP8
footprint CP-8-13 (8-Lead LFCSP (3X3))
footprint MSOP8(RM-8) (8-Lead MSOP); pin to pad 0>none
part A pins: 0 EP, 4 V-, 8 V+
part B pins: 1 Out, 2 -, 3 +
part C pins: 5 +, 6 -, 7 Out

## ADA4807-1AKSZ
designator U?, comment NicName: ADA4807  (hidden comment: U)
IC OPAMP VFB 1 CIRCUIT SC70-6; 04. Manufacturer: Analog Devices Inc.; 07. Manufacturer  Part Number: ADA4807-1AKSZ-R7; 03. Unit Price: 2.44; 13. Created Date/Name: AUG 2018 / Hören; ComponentLink1Description: Info; ComponentLink1URL: https://www.digikey.de/product-detail/en/analog-devices-inc/ADA4807-1AKSZ-R7/ADA4807-1AKSZ-R7DKR-ND/8594894; ComponentLink2Description: DataSheet; ComponentLink2URL: https://www.analog.com/media/en/technical-documentation/data-sheets/ADA4807-1_4807-2_4807-4.pdf; 01. Distributor: DigiKey; 02. Distributor Part Number: ADA4807-1AKSZ-R7DKR-ND; Package: SC70-6
footprint SC70-6
part A pins: 1 VOUT, 3 +, 4 -
part B pins: 2 -VS, 5 ~{PD}, 6 +VS
